# Altium footprint library Connectors_2,54mm.PcbLib: 400 footprints (part 26 of 26)
Each footprint in its own frame and in the unit in brackets; x right, y up, seen from the top. Pads: shape width x height; smd on the part's side, far side on the other; paste and mask are expansions set on the pad; w line width, h text height; cw(c..) or ccw(c..) is an arc to the next point about the centre after c.
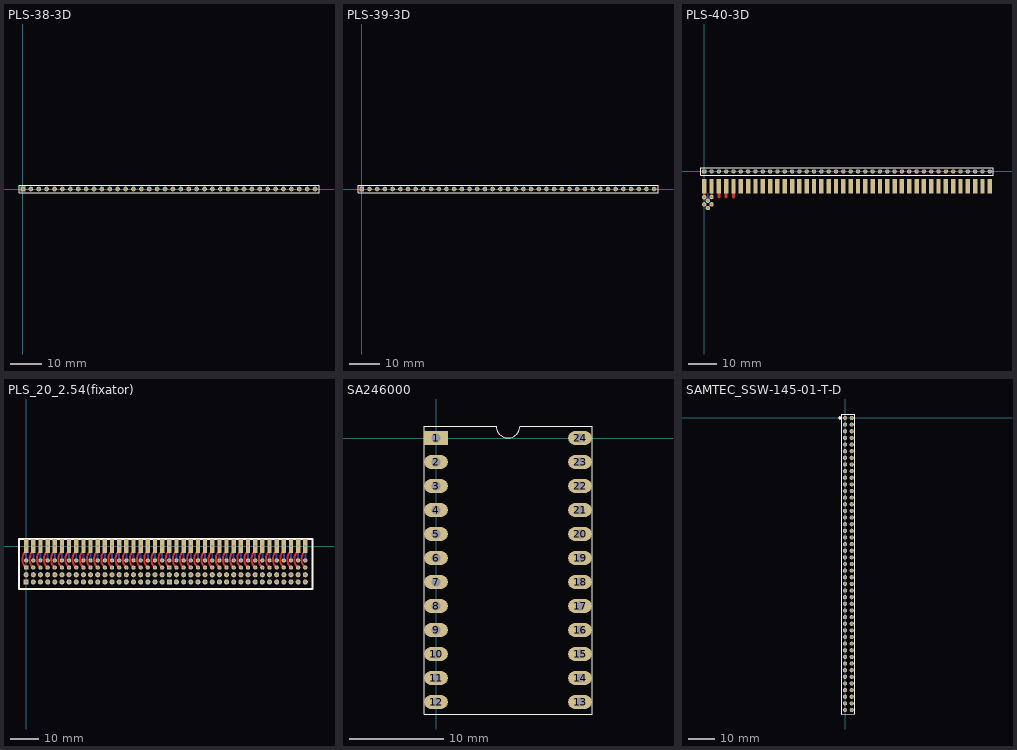
[diagram p25: the footprints below, top view; thin cyan lines are the x and y axes]

## PLS-38-3D [mm] "Connector; Header; 38 Position"
height 7.5
pads (38):
  rect 1.5x1.5 hole 0.9: 1(0,0)
  round 1.5 hole 0.9: 2(2.54,0) 3(5.08,0) 4(7.62,0) 5(10.16,0) 6(12.7,0) 7(15.24,0) 8(17.78,0) 9(20.32,0) 10(22.86,0) 11(25.4,0) 12(27.94,0) 13(30.48,0) 14(33.02,0) 15(35.56,0) 16(38.1,0) 17(40.64,0) 18(43.18,0) 19(45.72,0) 20(48.26,0) 21(50.8,0) 22(53.34,0) 23(55.88,0) 24(58.42,0) 25(60.96,0) 26(63.5,0) 27(66.04,0) 28(68.58,0) 29(71.12,0) 30(73.66,0) 31(76.2,0) 32(78.74,0) 33(81.28,0) 34(83.82,0) 35(86.36,0) 36(88.9,0) 37(91.44,0) 38(93.98,0)
Top Overlay:
  lines w0.2: -1.27,-1.27 -1.27,1.27 95.25,1.27 95.25,-1.27 -1.27,-1.27
3D body "PLS-1.step": height 8.44, standoff -3, extent 92.71,-1.27 95.25,1.27
3D body "PLS-1.step": height 8.44, standoff -3, extent 90.17,-1.27 92.71,1.27
3D body "PLS-1.step": height 8.44, standoff -3, extent 87.63,-1.27 90.17,1.27
3D body "PLS-1.step": height 8.44, standoff -3, extent -1.27,-1.27 1.27,1.27
3D body "PLS-1.step": height 8.44, standoff -3, extent 1.27,-1.27 3.81,1.27
3D body "PLS-1.step": height 8.44, standoff -3, extent 3.81,-1.27 6.35,1.27
3D body "PLS-1.step": height 8.44, standoff -3, extent 6.35,-1.27 8.89,1.27
3D body "PLS-1.step": height 8.44, standoff -3, extent 8.89,-1.27 11.43,1.27
3D body "PLS-1.step": height 8.44, standoff -3, extent 11.43,-1.27 13.97,1.27
3D body "PLS-1.step": height 8.44, standoff -3, extent 13.97,-1.27 16.51,1.27
3D body "PLS-1.step": height 8.44, standoff -3, extent 16.51,-1.27 19.05,1.27
3D body "PLS-1.step": height 8.44, standoff -3, extent 19.05,-1.27 21.59,1.27
3D body "PLS-1.step": height 8.44, standoff -3, extent 21.59,-1.27 24.13,1.27
3D body "PLS-1.step": height 8.44, standoff -3, extent 24.13,-1.27 26.67,1.27
3D body "PLS-1.step": height 8.44, standoff -3, extent 26.67,-1.27 29.21,1.27
3D body "PLS-1.step": height 8.44, standoff -3, extent 29.21,-1.27 31.75,1.27
3D body "PLS-1.step": height 8.44, standoff -3, extent 31.75,-1.27 34.29,1.27
3D body "PLS-1.step": height 8.44, standoff -3, extent 34.29,-1.27 36.83,1.27
3D body "PLS-1.step": height 8.44, standoff -3, extent 36.83,-1.27 39.37,1.27
3D body "PLS-1.step": height 8.44, standoff -3, extent 39.37,-1.27 41.91,1.27
3D body "PLS-1.step": height 8.44, standoff -3, extent 41.91,-1.27 44.45,1.27
3D body "PLS-1.step": height 8.44, standoff -3, extent 44.45,-1.27 46.99,1.27
3D body "PLS-1.step": height 8.44, standoff -3, extent 46.99,-1.27 49.53,1.27
3D body "PLS-1.step": height 8.44, standoff -3, extent 49.53,-1.27 52.07,1.27
3D body "PLS-1.step": height 8.44, standoff -3, extent 52.07,-1.27 54.61,1.27
3D body "PLS-1.step": height 8.44, standoff -3, extent 54.61,-1.27 57.15,1.27
3D body "PLS-1.step": height 8.44, standoff -3, extent 57.15,-1.27 59.69,1.27
3D body "PLS-1.step": height 8.44, standoff -3, extent 59.69,-1.27 62.23,1.27
3D body "PLS-1.step": height 8.44, standoff -3, extent 62.23,-1.27 64.77,1.27
3D body "PLS-1.step": height 8.44, standoff -3, extent 64.77,-1.27 67.31,1.27
3D body "PLS-1.step": height 8.44, standoff -3, extent 67.31,-1.27 69.85,1.27
3D body "PLS-1.step": height 8.44, standoff -3, extent 69.85,-1.27 72.39,1.27
3D body "PLS-1.step": height 8.44, standoff -3, extent 72.39,-1.27 74.93,1.27
3D body "PLS-1.step": height 8.44, standoff -3, extent 74.93,-1.27 77.47,1.27
3D body "PLS-1.step": height 8.44, standoff -3, extent 77.47,-1.27 80.01,1.27
3D body "PLS-1.step": height 8.44, standoff -3, extent 80.01,-1.27 82.55,1.27
3D body "PLS-1.step": height 8.44, standoff -3, extent 82.55,-1.27 85.09,1.27
3D body "PLS-1.step": height 8.44, standoff -3, extent 85.09,-1.27 87.63,1.27

## PLS-39-3D [mm] "Connector; Header; 39 Position"
height 7.5
pads (39):
  rect 1.5x1.5 hole 0.9: 1(0,0)
  round 1.5 hole 0.9: 2(2.54,0) 3(5.08,0) 4(7.62,0) 5(10.16,0) 6(12.7,0) 7(15.24,0) 8(17.78,0) 9(20.32,0) 10(22.86,0) 11(25.4,0) 12(27.94,0) 13(30.48,0) 14(33.02,0) 15(35.56,0) 16(38.1,0) 17(40.64,0) 18(43.18,0) 19(45.72,0) 20(48.26,0) 21(50.8,0) 22(53.34,0) 23(55.88,0) 24(58.42,0) 25(60.96,0) 26(63.5,0) 27(66.04,0) 28(68.58,0) 29(71.12,0) 30(73.66,0) 31(76.2,0) 32(78.74,0) 33(81.28,0) 34(83.82,0) 35(86.36,0) 36(88.9,0) 37(91.44,0) 38(93.98,0) 39(96.52,0)
Top Overlay:
  lines w0.2: -1.27,-1.27 97.79,-1.27 97.79,1.27 -1.27,1.27 -1.27,-1.27
3D body "PLS-1.step": height 8.44, standoff -3, extent 85.09,-1.27 87.63,1.27
3D body "PLS-1.step": height 8.44, standoff -3, extent 82.55,-1.27 85.09,1.27
3D body "PLS-1.step": height 8.44, standoff -3, extent 80.01,-1.27 82.55,1.27
3D body "PLS-1.step": height 8.44, standoff -3, extent 77.47,-1.27 80.01,1.27
3D body "PLS-1.step": height 8.44, standoff -3, extent 74.93,-1.27 77.47,1.27
3D body "PLS-1.step": height 8.44, standoff -3, extent 72.39,-1.27 74.93,1.27
3D body "PLS-1.step": height 8.44, standoff -3, extent 69.85,-1.27 72.39,1.27
3D body "PLS-1.step": height 8.44, standoff -3, extent 67.31,-1.27 69.85,1.27
3D body "PLS-1.step": height 8.44, standoff -3, extent 64.77,-1.27 67.31,1.27
3D body "PLS-1.step": height 8.44, standoff -3, extent 62.23,-1.27 64.77,1.27
3D body "PLS-1.step": height 8.44, standoff -3, extent 59.69,-1.27 62.23,1.27
3D body "PLS-1.step": height 8.44, standoff -3, extent 57.15,-1.27 59.69,1.27
3D body "PLS-1.step": height 8.44, standoff -3, extent 54.61,-1.27 57.15,1.27
3D body "PLS-1.step": height 8.44, standoff -3, extent 52.07,-1.27 54.61,1.27
3D body "PLS-1.step": height 8.44, standoff -3, extent 49.53,-1.27 52.07,1.27
3D body "PLS-1.step": height 8.44, standoff -3, extent 46.99,-1.27 49.53,1.27
3D body "PLS-1.step": height 8.44, standoff -3, extent 44.45,-1.27 46.99,1.27
3D body "PLS-1.step": height 8.44, standoff -3, extent 41.91,-1.27 44.45,1.27
3D body "PLS-1.step": height 8.44, standoff -3, extent 39.37,-1.27 41.91,1.27
3D body "PLS-1.step": height 8.44, standoff -3, extent 36.83,-1.27 39.37,1.27
3D body "PLS-1.step": height 8.44, standoff -3, extent 34.29,-1.27 36.83,1.27
3D body "PLS-1.step": height 8.44, standoff -3, extent 31.75,-1.27 34.29,1.27
3D body "PLS-1.step": height 8.44, standoff -3, extent 29.21,-1.27 31.75,1.27
3D body "PLS-1.step": height 8.44, standoff -3, extent 26.67,-1.27 29.21,1.27
3D body "PLS-1.step": height 8.44, standoff -3, extent 24.13,-1.27 26.67,1.27
3D body "PLS-1.step": height 8.44, standoff -3, extent 21.59,-1.27 24.13,1.27
3D body "PLS-1.step": height 8.44, standoff -3, extent 19.05,-1.27 21.59,1.27
3D body "PLS-1.step": height 8.44, standoff -3, extent 16.51,-1.27 19.05,1.27
3D body "PLS-1.step": height 8.44, standoff -3, extent 13.97,-1.27 16.51,1.27
3D body "PLS-1.step": height 8.44, standoff -3, extent 11.43,-1.27 13.97,1.27
3D body "PLS-1.step": height 8.44, standoff -3, extent 8.89,-1.27 11.43,1.27
3D body "PLS-1.step": height 8.44, standoff -3, extent 6.35,-1.27 8.89,1.27
3D body "PLS-1.step": height 8.44, standoff -3, extent 3.81,-1.27 6.35,1.27
3D body "PLS-1.step": height 8.44, standoff -3, extent 1.27,-1.27 3.81,1.27
3D body "PLS-1.step": height 8.44, standoff -3, extent -1.27,-1.27 1.27,1.27
3D body "PLS-1.step": height 8.44, standoff -3, extent 87.63,-1.27 90.17,1.27
3D body "PLS-1.step": height 8.44, standoff -3, extent 90.17,-1.27 92.71,1.27
3D body "PLS-1.step": height 8.44, standoff -3, extent 92.71,-1.27 95.25,1.27
3D body "PLS-1.step": height 8.44, standoff -3, extent 95.25,-1.27 97.79,1.27

## PLS-40-3D [mm] "Connector; Header; 40 Position"
height 7.5
pads (86):
  rect 1.524x5 all layers, no hole: 1(0,-5.08) 1(2.54,-5.08) 1(5.08,-5.08) 1(7.62,-5.08) 1(10.16,-5.08) 1(12.7,-5.08) 1(15.24,-5.08) 1(17.78,-5.08) 1(20.32,-5.08) 1(22.86,-5.08) 1(25.4,-5.08) 1(27.94,-5.08) 1(30.48,-5.08) 1(33.02,-5.08) 1(35.56,-5.08) 1(38.1,-5.08) 1(40.64,-5.08) 1(43.18,-5.08) 1(45.72,-5.08) 1(48.26,-5.08) 1(50.8,-5.08) 1(53.34,-5.08) 1(55.88,-5.08) 1(58.42,-5.08) 1(60.96,-5.08) 1(63.5,-5.08) 1(66.04,-5.08) 1(68.58,-5.08) 1(71.12,-5.08) 1(73.66,-5.08) 1(76.2,-5.08) 1(78.74,-5.08) 1(81.28,-5.08) 1(83.82,-5.08) 1(86.36,-5.08) 1(88.9,-5.08) 1(91.44,-5.08) 1(93.98,-5.08) 1(96.52,-5.08) 1(99.06,-5.08)
  rect 1.5x1.5 hole 0.9: 1(0,0)
  round 1.524 hole 0.762: 1(1.27,-10.16) 1(2.54,-8.89) 2(0,-11.43) 3(2.54,-11.43) 4(1.27,-12.7)
  round 1.5 hole 0.9: 2(2.54,0) 3(5.08,0) 4(7.62,0) 5(10.16,0) 6(12.7,0) 7(15.24,0) 8(17.78,0) 9(20.32,0) 10(22.86,0) 11(25.4,0) 12(27.94,0) 13(30.48,0) 14(33.02,0) 15(35.56,0) 16(38.1,0) 17(40.64,0) 18(43.18,0) 19(45.72,0) 20(48.26,0) 21(50.8,0) 22(53.34,0) 23(55.88,0) 24(58.42,0) 25(60.96,0) 26(63.5,0) 27(66.04,0) 28(68.58,0) 29(71.12,0) 30(73.66,0) 31(76.2,0) 32(78.74,0) 33(81.28,0) 34(83.82,0) 35(86.36,0) 36(88.9,0) 37(91.44,0) 38(93.98,0) 39(96.52,0) 40(99.06,0)
  oct 1.524x1.524 hole 0.762: 5(0,-8.89)
Top Layer:
  lines w0.8: 0,-8.89 0,-5.08 ; 2.54,-8.89 2.54,-5.08
  lines w1: 5.08,-8.89 5.08,-5.08 ; 7.62,-8.89 7.62,-5.08 ; 10.16,-8.89 10.16,-5.08
Bottom Layer:
  lines w0.5: 1.27,-10.16 1.27,-7.62
Top Overlay:
  lines w0.2: -1.27,-1.27 100.33,-1.27 100.33,1.27 -1.27,1.27 -1.27,-1.27
3D body "PLS-1.step": height 8.44, standoff -3, extent -1.27,-1.27 1.27,1.27
3D body "PLS-1.step": height 8.44, standoff -3, extent 1.27,-1.27 3.81,1.27
3D body "PLS-1.step": height 8.44, standoff -3, extent 3.81,-1.27 6.35,1.27
3D body "PLS-1.step": height 8.44, standoff -3, extent 6.35,-1.27 8.89,1.27
3D body "PLS-1.step": height 8.44, standoff -3, extent 8.89,-1.27 11.43,1.27
3D body "PLS-1.step": height 8.44, standoff -3, extent 11.43,-1.27 13.97,1.27
3D body "PLS-1.step": height 8.44, standoff -3, extent 13.97,-1.27 16.51,1.27
3D body "PLS-1.step": height 8.44, standoff -3, extent 16.51,-1.27 19.05,1.27
3D body "PLS-1.step": height 8.44, standoff -3, extent 19.05,-1.27 21.59,1.27
3D body "PLS-1.step": height 8.44, standoff -3, extent 21.59,-1.27 24.13,1.27
3D body "PLS-1.step": height 8.44, standoff -3, extent 24.13,-1.27 26.67,1.27
3D body "PLS-1.step": height 8.44, standoff -3, extent 26.67,-1.27 29.21,1.27
3D body "PLS-1.step": height 8.44, standoff -3, extent 29.21,-1.27 31.75,1.27
3D body "PLS-1.step": height 8.44, standoff -3, extent 31.75,-1.27 34.29,1.27
3D body "PLS-1.step": height 8.44, standoff -3, extent 34.29,-1.27 36.83,1.27
3D body "PLS-1.step": height 8.44, standoff -3, extent 36.83,-1.27 39.37,1.27
3D body "PLS-1.step": height 8.44, standoff -3, extent 39.37,-1.27 41.91,1.27
3D body "PLS-1.step": height 8.44, standoff -3, extent 41.91,-1.27 44.45,1.27
3D body "PLS-1.step": height 8.44, standoff -3, extent 44.45,-1.27 46.99,1.27
3D body "PLS-1.step": height 8.44, standoff -3, extent 46.99,-1.27 49.53,1.27
3D body "PLS-1.step": height 8.44, standoff -3, extent 49.53,-1.27 52.07,1.27
3D body "PLS-1.step": height 8.44, standoff -3, extent 52.07,-1.27 54.61,1.27
3D body "PLS-1.step": height 8.44, standoff -3, extent 54.61,-1.27 57.15,1.27
3D body "PLS-1.step": height 8.44, standoff -3, extent 57.15,-1.27 59.69,1.27
3D body "PLS-1.step": height 8.44, standoff -3, extent 59.69,-1.27 62.23,1.27
3D body "PLS-1.step": height 8.44, standoff -3, extent 62.23,-1.27 64.77,1.27
3D body "PLS-1.step": height 8.44, standoff -3, extent 64.77,-1.27 67.31,1.27
3D body "PLS-1.step": height 8.44, standoff -3, extent 67.31,-1.27 69.85,1.27
3D body "PLS-1.step": height 8.44, standoff -3, extent 69.85,-1.27 72.39,1.27
3D body "PLS-1.step": height 8.44, standoff -3, extent 72.39,-1.27 74.93,1.27
3D body "PLS-1.step": height 8.44, standoff -3, extent 74.93,-1.27 77.47,1.27
3D body "PLS-1.step": height 8.44, standoff -3, extent 77.47,-1.27 80.01,1.27
3D body "PLS-1.step": height 8.44, standoff -3, extent 80.01,-1.27 82.55,1.27
3D body "PLS-1.step": height 8.44, standoff -3, extent 82.55,-1.27 85.09,1.27
3D body "PLS-1.step": height 8.44, standoff -3, extent 85.09,-1.27 87.63,1.27
3D body "PLS-1.step": height 8.44, standoff -3, extent 87.63,-1.27 90.17,1.27
3D body "PLS-1.step": height 8.44, standoff -3, extent 90.17,-1.27 92.71,1.27
3D body "PLS-1.step": height 8.44, standoff -3, extent 92.71,-1.27 95.25,1.27
3D body "PLS-1.step": height 8.44, standoff -3, extent 95.25,-1.27 97.79,1.27
3D body "PLS-1.step": height 8.44, standoff -3, extent 97.79,-1.27 100.33,1.27

## PLS_20_2.54(fixator) [mil]
pads (200):
  round 70.87 hole 35.43: 1(0,-400) 1(200,-400) 1(400,-400) 1(600,-400) 1(800,-400) 1(1000,-400) 1(1200,-400) 1(1400,-400) 1(1600,-400) 1(1800,-400) 1(2000,-400) 1(2200,-400) 1(2400,-400) 1(2600,-400) 1(2800,-400) 1(3000,-400) 1(3200,-400) 1(3400,-400) 1(3600,-400) 1(3800,-400) 2(100,-400) 2(300,-400) 2(500,-400) 2(700,-400) 2(900,-400) 2(1100,-400) 2(1300,-400) 2(1500,-400) 2(1700,-400) 2(1900,-400) 2(2100,-400) 2(2300,-400) 2(2500,-400) 2(2700,-400) 2(2900,-400) 2(3100,-400) 2(3300,-400) 2(3500,-400) 2(3700,-400) 2(3900,-400) 3(200,-500) 3(400,-500) 3(600,-500) 3(800,-500) 3(1000,-500) 3(1200,-500) 3(1400,-500) 3(1600,-500) 3(1800,-500) 3(2200,-500) 3(2400,-500) 3(2600,-500) 3(2800,-500) 3(3000,-500) 3(3200,-500) 3(3400,-500) 3(3600,-500) 3(3800,-500) 4(100,-500) 4(300,-500) 4(500,-500) 4(700,-500) 4(900,-500) 4(1100,-500) 4(1300,-500) 4(1500,-500) 4(1700,-500) 4(1900,-500) 4(2100,-500) 4(2300,-500) 4(2500,-500) 4(2700,-500) 4(2900,-500) 4(3100,-500) 4(3300,-500) 4(3500,-500) 4(3700,-500) 4(3900,-500)
  rect 60x196.85 hole 30: 1(0,0) 1(100,0) 1(200,0) 1(300,0) 1(400,0) 1(500,0) 1(600,0) 1(700,0) 1(800,0) 1(900,0) 1(1000,0) 1(1100,0) 1(1200,0) 1(1300,0) 1(1400,0) 1(1500,0) 1(1600,0) 1(1700,0) 1(1800,0) 1(1900,0) 1(2000,0) 1(2100,0) 1(2200,0) 1(2300,0) 1(2400,0) 1(2500,0) 1(2600,0) 1(2700,0) 1(2800,0) 1(2900,0) 1(3000,0) 1(3100,0) 1(3200,0) 1(3300,0) 1(3400,0) 1(3500,0) 1(3600,0) 1(3700,0) 1(3800,0) 1(3900,0)
  round 60 hole 30: 1(100,-200) 1(600,-200) 1(1100,-200) 1(1600,-200) 1(2100,-200) 1(2600,-200) 1(3100,-200) 1(3600,-200) 2(0,-200) 2(500,-200) 2(1000,-200) 2(1500,-200) 2(2000,-200) 2(2500,-200) 2(3000,-200) 2(3500,-200) 3(500,-300) 3(1000,-300) 3(1500,-300) 3(2500,-300) 3(3000,-300) 3(3500,-300) 4(100,-300) 4(600,-300) 4(1100,-300) 4(1600,-300) 4(2100,-300) 4(2600,-300) 4(3100,-300) 4(3600,-300) 5(200,-200) 5(700,-200) 5(1200,-200) 5(1700,-200) 5(2200,-200) 5(2700,-200) 5(3200,-200) 5(3700,-200) 6(300,-200) 6(800,-200) 6(1300,-200) 6(1800,-200) 6(2300,-200) 6(2800,-200) 6(3300,-200) 6(3800,-200) 7(200,-300) 7(700,-300) 7(1200,-300) 7(1700,-300) 7(2200,-300) 7(2700,-300) 7(3200,-300) 7(3700,-300) 8(300,-300) 8(800,-300) 8(1300,-300) 8(1800,-300) 8(2300,-300) 8(2800,-300) 8(3300,-300) 8(3800,-300) 9(400,-200) 9(900,-200) 9(1400,-200) 9(1900,-200) 9(2400,-200) 9(2900,-200) 9(3400,-200) 9(3900,-200) 10(400,-300) 10(900,-300) 10(1400,-300) 10(1900,-300) 10(2400,-300) 10(2900,-300) 10(3400,-300) 10(3900,-300)
  rect 70.87x70.87 hole 35.43: 3(0,-500) 3(2000,-500)
  rect 60x60 hole 30: 3(0,-300) 3(2000,-300)
Top Layer:
  lines w27.56: 0,-300 -14.64,-285.36 cw(c70.71,-200) -50,-200 -50,-169 cw(c70.71,-169) -14.64,-83.64 0,-69 ; 100,-300 85.36,-285.36 cw(c170.71,-200) 50,-200 50,-169 cw(c170.71,-169) 85.36,-83.64 100,-69 ; 200,-300 185.36,-285.36 cw(c270.71,-200) 150,-200 150,-169 cw(c270.71,-169) 185.36,-83.64 200,-69 ; 300,-300 285.36,-285.36 cw(c370.71,-200) 250,-200 250,-169 cw(c370.71,-169) 285.36,-83.64 300,-69 ; 400,-300 385.36,-285.36 cw(c470.71,-200) 350,-200 350,-169 cw(c470.71,-169) 385.36,-83.64 400,-69 ; 485.36,-83.64 ccw(c570.71,-169) 450,-169 450,-200 ccw(c570.71,-200) 485.36,-285.36 500,-300 ; 585.36,-83.64 ccw(c670.71,-169) 550,-169 550,-200 ccw(c670.71,-200) 585.36,-285.36 600,-300 ; 685.36,-83.64 ccw(c770.71,-169) 650,-169 650,-200 ccw(c770.71,-200) 685.36,-285.36 700,-300 ; 785.36,-83.64 ccw(c870.71,-169) 750,-169 750,-200 ccw(c870.71,-200) 785.36,-285.36 800,-300 ; 885.36,-83.64 ccw(c970.71,-169) 850,-169 850,-200 ccw(c970.71,-200) 885.36,-285.36 900,-300 ; 985.36,-83.64 ccw(c1070.71,-169) 950,-169 950,-200 ccw(c1070.71,-200) 985.36,-285.36 1000,-300 ; 1085.36,-83.64 ccw(c1170.71,-169) 1050,-169 1050,-200 ccw(c1170.71,-200) 1085.36,-285.36 1100,-300 ; 1185.36,-83.64 ccw(c1270.71,-169) 1150,-169 1150,-200 ccw(c1270.71,-200) 1185.36,-285.36 1200,-300 ; 1285.36,-83.64 ccw(c1370.71,-169) 1250,-169 1250,-200 ccw(c1370.71,-200) 1285.36,-285.36 1300,-300 ; 1385.36,-83.64 ccw(c1470.71,-169) 1350,-169 1350,-200 ccw(c1470.71,-200) 1385.36,-285.36 1400,-300 ; 1485.36,-83.64 ccw(c1570.71,-169) 1450,-169 1450,-200 ccw(c1570.71,-200) 1485.36,-285.36 1500,-300 ; 1585.36,-83.64 ccw(c1670.71,-169) 1550,-169 1550,-200 ccw(c1670.71,-200) 1585.36,-285.36 1600,-300 ; 1685.36,-83.64 ccw(c1770.71,-169) 1650,-169 1650,-200 ccw(c1770.71,-200) 1685.36,-285.36 1700,-300 ; 1785.36,-83.64 ccw(c1870.71,-169) 1750,-169 1750,-200 ccw(c1870.71,-200) 1785.36,-285.36 1800,-300 ; 1885.36,-83.64 ccw(c1970.71,-169) 1850,-169 1850,-200 ccw(c1970.71,-200) 1885.36,-285.36 1900,-300 ; 1985.36,-83.64 ccw(c2070.71,-169) 1950,-169 1950,-200 ccw(c2070.71,-200) 1985.36,-285.36 2000,-300 ; 2085.36,-83.64 ccw(c2170.71,-169) 2050,-169 2050,-200 ccw(c2170.71,-200) 2085.36,-285.36 2100,-300 ; 2185.36,-83.64 ccw(c2270.71,-169) 2150,-169 2150,-200 ccw(c2270.71,-200) 2185.36,-285.36 2200,-300 ; 2285.36,-83.64 ccw(c2370.71,-169) 2250,-169 2250,-200 ccw(c2370.71,-200) 2285.36,-285.36 2300,-300 ; 2385.36,-83.64 ccw(c2470.71,-169) 2350,-169 2350,-200 ccw(c2470.71,-200) 2385.36,-285.36 2400,-300 ; 2485.36,-83.64 ccw(c2570.71,-169) 2450,-169 2450,-200 ccw(c2570.71,-200) 2485.36,-285.36 2500,-300 ; 2585.36,-83.64 ccw(c2670.71,-169) 2550,-169 2550,-200 ccw(c2670.71,-200) 2585.36,-285.36 2600,-300 ; 2685.36,-83.64 ccw(c2770.71,-169) 2650,-169 2650,-200 ccw(c2770.71,-200) 2685.36,-285.36 2700,-300 ; 2785.36,-83.64 ccw(c2870.71,-169) 2750,-169 2750,-200 ccw(c2870.71,-200) 2785.36,-285.36 2800,-300 ; 2885.36,-83.64 ccw(c2970.71,-169) 2850,-169 2850,-200 ccw(c2970.71,-200) 2885.36,-285.36 2900,-300 ; 2985.36,-83.64 ccw(c3070.71,-169) 2950,-169 2950,-200 ccw(c3070.71,-200) 2985.36,-285.36 3000,-300 ; 3085.36,-83.64 ccw(c3170.71,-169) 3050,-169 3050,-200 ccw(c3170.71,-200) 3085.36,-285.36 3100,-300 ; 3185.36,-83.64 ccw(c3270.71,-169) 3150,-169 3150,-200 ccw(c3270.71,-200) 3185.36,-285.36 3200,-300 ; 3285.36,-83.64 ccw(c3370.71,-169) 3250,-169 3250,-200 ccw(c3370.71,-200) 3285.36,-285.36 3300,-300 ; 3385.36,-83.64 ccw(c3470.71,-169) 3350,-169 3350,-200 ccw(c3470.71,-200) 3385.36,-285.36 3400,-300 ; 3485.36,-83.64 ccw(c3570.71,-169) 3450,-169 3450,-200 ccw(c3570.71,-200) 3485.36,-285.36 3500,-300 ; 3585.36,-83.64 ccw(c3670.71,-169) 3550,-169 3550,-200 ccw(c3670.71,-200) 3585.36,-285.36 3600,-300 ; 3685.36,-83.64 ccw(c3770.71,-169) 3650,-169 3650,-200 ccw(c3770.71,-200) 3685.36,-285.36 3700,-300 ; 3785.36,-83.64 ccw(c3870.71,-169) 3750,-169 3750,-200 ccw(c3870.71,-200) 3785.36,-285.36 3800,-300 ; 3885.36,-83.64 ccw(c3970.71,-169) 3850,-169 3850,-200 ccw(c3970.71,-200) 3885.36,-285.36 3900,-300
Bottom Layer:
  lines w27.56: 0,-200 0,0 ; 100,-200 100,-12 ; 200,-200 200,0 ; 300,-200 300,10 ; 400,-200 400,0 ; 500,-200 500,0 ; 600,-200 600,-12 ; 700,-200 700,0 ; 800,-200 800,10 ; 900,-200 900,0 ; 1000,-200 1000,0 ; 1100,-200 1100,-12 ; 1200,-200 1200,0 ; 1300,-200 1300,10 ; 1400,-200 1400,0 ; 1500,-200 1500,0 ; 1600,-200 1600,-12 ; 1700,-200 1700,0 ; 1800,-200 1800,10 ; 1900,-200 1900,0 ; 2000,-200 2000,0 ; 2100,-200 2100,-12 ; 2200,-200 2200,0 ; 2300,-200 2300,10 ; 2400,-200 2400,0 ; 2500,-200 2500,0 ; 2600,-200 2600,-12 ; 2700,-200 2700,0 ; 2800,-200 2800,10 ; 2900,-200 2900,0 ; 3000,-200 3000,0 ; 3100,-200 3100,-12 ; 3200,-200 3200,0 ; 3300,-200 3300,10 ; 3400,-200 3400,0 ; 3500,-200 3500,0 ; 3600,-200 3600,-12 ; 3700,-200 3700,0 ; 3800,-200 3800,10 ; 3900,-200 3900,0
Top Overlay:
  lines w27.56: -100,-600 4000,-600 4000,100 -100,100 -100,-600
3D body "User Library-PBD2_54-40.step": height 100, standoff -100, extent -49.99,-6.29 1950.01,430.71
3D body "User Library-PBD2_54-40.step": height 100, standoff -100, extent 1950.01,-6.29 3950.01,430.71

## SA246000 [mm]
pads (24):
  rect 2.5x1.5 hole 0.9: 1(0,0)
  oval 2.5x1.5 hole 0.9: 2(0,-2.54) 3(0,-5.08) 4(0,-7.62) 5(0,-10.16) 6(0,-12.7) 7(0,-15.24) 8(0,-17.78) 9(0,-20.32) 10(0,-22.86) 11(0,-25.4) 12(0,-27.94) 13(15.24,-27.94) 14(15.24,-25.4) 15(15.24,-22.86) 16(15.24,-20.32) 17(15.24,-17.78) 18(15.24,-15.24) 19(15.24,-12.7) 20(15.24,-10.16) 21(15.24,-7.62) 22(15.24,-5.08) 23(15.24,-2.54) 24(15.24,0)
Top Overlay:
  lines w0.1: -1.27,-29.21 16.51,-29.21 16.51,1.27 8.89,1.27 cw(c7.62,1.27) 6.35,1.27 -1.27,1.27 -1.27,-29.21
3D body "110-87-624-41-001101.stp": height 4.3, standoff -3.07, extent -1.23,-29.22 16.47,1.28

## SAMTEC_SSW-145-01-T-D [mm]
pads (90):
  round 1.6 / inner round 1.6 / far side round 1.8 hole 1: 1(0,0) 2(2.54,0) 3(0,-2.54) 4(2.54,-2.54) 5(0,-5.08) 6(2.54,-5.08) 7(0,-7.62) 8(2.54,-7.62) 9(0,-10.16) 10(2.54,-10.16) 11(0,-12.7) 12(2.54,-12.7) 13(0,-15.24) 14(2.54,-15.24) 15(0,-17.78) 16(2.54,-17.78) 17(0,-20.32) 18(2.54,-20.32) 19(0,-22.86) 20(2.54,-22.86) 21(0,-25.4) 22(2.54,-25.4) 23(0,-27.94) 24(2.54,-27.94) 25(0,-30.48) 26(2.54,-30.48) 27(0,-33.02) 28(2.54,-33.02) 29(0,-35.56) 30(2.54,-35.56) 31(0,-38.1) 32(2.54,-38.1) 33(0,-40.64) 34(2.54,-40.64) 35(0,-43.18) 36(2.54,-43.18) 37(0,-45.72) 38(2.54,-45.72) 39(0,-48.26) 40(2.54,-48.26) 41(0,-50.8) 42(2.54,-50.8) 43(0,-53.34) 44(2.54,-53.34) 45(0,-55.88) 46(2.54,-55.88) 47(0,-58.42) 48(2.54,-58.42) 49(0,-60.96) 50(2.54,-60.96) 51(0,-63.5) 52(2.54,-63.5) 53(0,-66.04) 54(2.54,-66.04) 55(0,-68.58) 56(2.54,-68.58) 57(0,-71.12) 58(2.54,-71.12) 59(0,-73.66) 60(2.54,-73.66) 61(0,-76.2) 62(2.54,-76.2) 63(0,-78.74) 64(2.54,-78.74) 65(0,-81.28) 66(2.54,-81.28) 67(0,-83.82) 68(2.54,-83.82) 69(0,-86.36) 70(2.54,-86.36) 71(0,-88.9) 72(2.54,-88.9) 73(0,-91.44) 74(2.54,-91.44) 75(0,-93.98) 76(2.54,-93.98) 77(0,-96.52) 78(2.54,-96.52) 79(0,-99.06) 80(2.54,-99.06) 81(0,-101.6) 82(2.54,-101.6) 83(0,-104.14) 84(2.54,-104.14) 85(0,-106.68) 86(2.54,-106.68) 87(0,-109.22) 88(2.54,-109.22) 89(0,-111.76) 90(2.54,-111.76)
Top Overlay:
  lines w0.152: -1.194,-113.284 3.759,-113.284 3.759,1.524 -1.194,1.524 -1.194,-113.284
  lines w0.508: -1.905,-0.381 ccw(c-1.905,0) -1.905,0.381 ccw(c-1.905,0) -1.905,-0.381
Mechanical 13:
  lines w0.152: -1.194,-113.284 3.759,-113.284 3.759,1.524 -1.194,1.524 -1.194,-113.284
  lines w0.508: -2.286,0 ccw(c-1.905,0) -1.524,0 ccw(c-1.905,0) -2.286,0
3D body "PBD-2.stp": height 8.5, standoff -3.15, extent -1.27,-34.29 1.27,-29.21
3D body "PBD-2.stp": height 8.5, standoff -3.15, extent -1.27,-29.21 1.27,-24.13
3D body "PBD-2.stp": height 8.5, standoff -3.15, extent -1.27,-24.13 1.27,-19.05
3D body "PBD-2.stp": height 8.5, standoff -3.15, extent -1.27,-19.05 1.27,-13.97
3D body "PBD-2.stp": height 8.5, standoff -3.15, extent -1.27,-13.97 1.27,-8.89
3D body "PBD-2.stp": height 8.5, standoff -3.15, extent -1.27,-8.89 1.27,-3.81
3D body "PBD-2.stp": height 8.5, standoff -3.15, extent -1.27,-3.81 1.27,1.27
3D body "PBS-1.stp": height 8.5, standoff -3.15, extent -1.27,-36.83 1.27,-34.29
3D body "PBD-2.stp": height 8.5, standoff -3.15, extent 1.27,-34.29 3.81,-29.21
3D body "PBD-2.stp": height 8.5, standoff -3.15, extent 1.27,-29.21 3.81,-24.13
3D body "PBD-2.stp": height 8.5, standoff -3.15, extent 1.27,-24.13 3.81,-19.05
3D body "PBD-2.stp": height 8.5, standoff -3.15, extent 1.27,-19.05 3.81,-13.97
3D body "PBD-2.stp": height 8.5, standoff -3.15, extent 1.27,-13.97 3.81,-8.89
3D body "PBD-2.stp": height 8.5, standoff -3.15, extent 1.27,-8.89 3.81,-3.81
3D body "PBD-2.stp": height 8.5, standoff -3.15, extent 1.27,-3.81 3.81,1.27
3D body "PBS-1.stp": height 8.5, standoff -3.15, extent 1.27,-36.83 3.81,-34.29
3D body "PBD-2.stp": height 8.5, standoff -3.15, extent -1.27,-72.39 1.27,-67.31
3D body "PBD-2.stp": height 8.5, standoff -3.15, extent -1.27,-67.31 1.27,-62.23
3D body "PBD-2.stp": height 8.5, standoff -3.15, extent -1.27,-62.23 1.27,-57.15
3D body "PBD-2.stp": height 8.5, standoff -3.15, extent -1.27,-57.15 1.27,-52.07
3D body "PBD-2.stp": height 8.5, standoff -3.15, extent -1.27,-52.07 1.27,-46.99
3D body "PBD-2.stp": height 8.5, standoff -3.15, extent -1.27,-46.99 1.27,-41.91
3D body "PBD-2.stp": height 8.5, standoff -3.15, extent -1.27,-41.91 1.27,-36.83
3D body "PBS-1.stp": height 8.5, standoff -3.15, extent -1.27,-74.93 1.27,-72.39
3D body "PBD-2.stp": height 8.5, standoff -3.15, extent 1.27,-72.39 3.81,-67.31
3D body "PBD-2.stp": height 8.5, standoff -3.15, extent 1.27,-67.31 3.81,-62.23
3D body "PBD-2.stp": height 8.5, standoff -3.15, extent 1.27,-62.23 3.81,-57.15
3D body "PBD-2.stp": height 8.5, standoff -3.15, extent 1.27,-57.15 3.81,-52.07
3D body "PBD-2.stp": height 8.5, standoff -3.15, extent 1.27,-52.07 3.81,-46.99
3D body "PBD-2.stp": height 8.5, standoff -3.15, extent 1.27,-46.99 3.81,-41.91
3D body "PBD-2.stp": height 8.5, standoff -3.15, extent 1.27,-41.91 3.81,-36.83
3D body "PBS-1.stp": height 8.5, standoff -3.15, extent 1.27,-74.93 3.81,-72.39
3D body "PBD-2.stp": height 8.5, standoff -3.15, extent -1.27,-110.49 1.27,-105.41
3D body "PBD-2.stp": height 8.5, standoff -3.15, extent -1.27,-105.41 1.27,-100.33
3D body "PBD-2.stp": height 8.5, standoff -3.15, extent -1.27,-100.33 1.27,-95.25
3D body "PBD-2.stp": height 8.5, standoff -3.15, extent -1.27,-95.25 1.27,-90.17
3D body "PBD-2.stp": height 8.5, standoff -3.15, extent -1.27,-90.17 1.27,-85.09
3D body "PBD-2.stp": height 8.5, standoff -3.15, extent -1.27,-85.09 1.27,-80.01
3D body "PBD-2.stp": height 8.5, standoff -3.15, extent -1.27,-80.01 1.27,-74.93
3D body "PBS-1.stp": height 8.5, standoff -3.15, extent -1.27,-113.03 1.27,-110.49
3D body "PBD-2.stp": height 8.5, standoff -3.15, extent 1.27,-110.49 3.81,-105.41
3D body "PBD-2.stp": height 8.5, standoff -3.15, extent 1.27,-105.41 3.81,-100.33
3D body "PBD-2.stp": height 8.5, standoff -3.15, extent 1.27,-100.33 3.81,-95.25
3D body "PBD-2.stp": height 8.5, standoff -3.15, extent 1.27,-95.25 3.81,-90.17
3D body "PBD-2.stp": height 8.5, standoff -3.15, extent 1.27,-90.17 3.81,-85.09
3D body "PBD-2.stp": height 8.5, standoff -3.15, extent 1.27,-85.09 3.81,-80.01
3D body "PBD-2.stp": height 8.5, standoff -3.15, extent 1.27,-80.01 3.81,-74.93
3D body "PBS-1.stp": height 8.5, standoff -3.15, extent 1.27,-113.03 3.81,-110.49